# Altium footprint library Cty1.PcbLib: 869 footprints (part 14 of 55)
Each footprint in its own frame and in the unit in brackets; x right, y up, seen from the top. Pads: shape width x height; smd on the part's side, far side on the other; paste and mask are expansions set on the pad; w line width, h text height; cw(c..) or ccw(c..) is an arc to the next point about the centre after c.
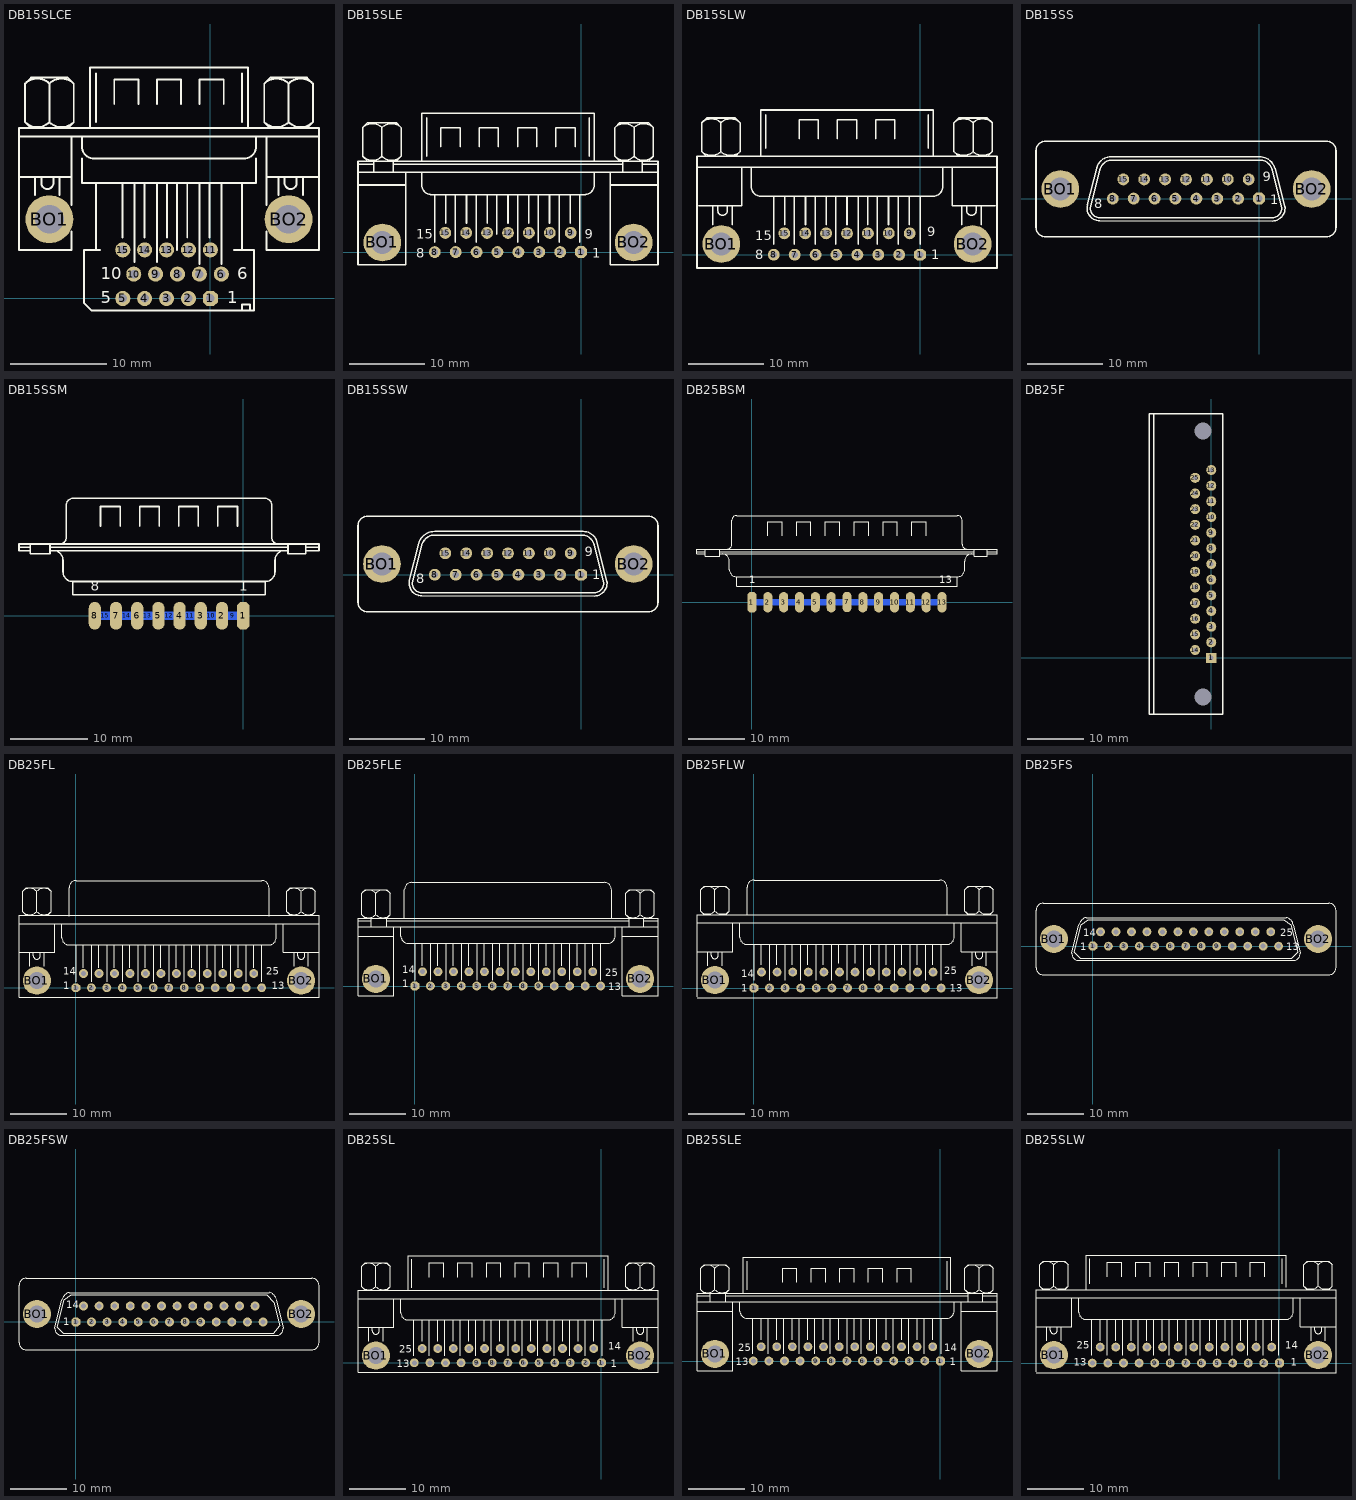
[diagram p13: the footprints below, top view; thin cyan lines are the x and y axes]

## DB15SLCE [mil]
pads (17):
  oct 62x62 hole 35: 1(0,0)
  round 62 hole 35: 2(-90,0) 3(-180,0) 4(-270,0) 5(-360,0) 6(45,100) 7(-45,100) 8(-135,100) 9(-225,100) 10(-315,100) 11(0,200) 12(-90,200) 13(-180,200) 14(-270,200) 15(-360,200)
  round 196.67 hole 118.33: BO1(-661.67,325.83) BO2(321.67,325.83)
Top Overlay:
  lines w8: -786.67,500 -570,500 ; -786.67,666.67 446.67,666.67 ; -761.75,724.91 ccw(c-711.67,775) -661.58,724.91 ; -761.75,883.42 cw(c-711.67,833.33) -661.58,883.42 ; -736.67,700 -761.67,725 -761.67,883.33 -736.67,908.33 -586.67,908.33 -561.67,883.33 -561.67,725 -586.67,700 ; -720,425 -720,500 ; -695,500 -695,475 ccw(c-670,475) -645,475 -645,500 ; -661.75,724.91 ccw(c-611.67,775) -561.58,724.91 ; -661.75,883.42 cw(c-611.67,833.33) -561.58,883.42 ; -661.67,725 -661.67,883.33 ; -620,425 -620,500 ; -570,275 -570,200 -786.67,200 -786.67,700 446.67,700 446.67,200 230,200 230,275 ; -570,383.33 -570,500 ; -570,666.67 -570,500 ; -528.33,575 -528.33,475 188.33,475 188.33,575 ; -528.33,666.67 -528.33,625 ccw(c-478.33,625) -478.33,575 138.33,575 ccw(c138.33,625) 188.33,625 188.33,666.67 ; -495,700 -495,950 155,950 155,700 ; -470,200 -470,475 ; -470,725 -470,925 ; -453.33,200 -520,200 -520,-16.67 -486.67,-50 146.67,-50 180,-50 180,200 96.67,200 ; -395,800 -395,900 -295,900 -295,800 ; -361.67,250 -361.67,475 ; -311.67,150 -311.67,475 ; -270,250 -270,475 ; -220,150 -220,475 ; -220,800 -220,900 -120,900 -120,800 ; -178.33,250 -178.33,475 ; -136.67,200 -136.67,475 ; -95,250 -95,475 ; -45,141.67 -45,475 ; -45,800 -45,900 55,900 55,800 ; -3.33,250 -3.33,475 ; 46.67,141.67 46.67,475 ; 130,-50 130,-25 163.33,-25 163.33,-50 ; 130,200 130,475 ; 130,725 130,925 ; 221.58,724.91 ccw(c271.67,775) 321.75,724.91 ; 221.58,883.42 cw(c271.67,833.33) 321.75,883.42 ; 230,383.33 230,500 ; 230,666.67 230,500 ; 246.67,700 221.67,725 221.67,883.33 246.67,908.33 396.67,908.33 421.67,883.33 421.67,725 396.67,700 ; 280,425 280,500 ; 305,500 305,475 ccw(c330,475) 355,475 355,500 ; 321.58,724.91 ccw(c371.67,775) 421.75,724.91 ; 321.58,883.42 cw(c371.67,833.33) 421.75,883.42 ; 321.67,725 321.67,883.33 ; 380,425 380,500 ; 446.67,500 230,500
  text "1" at 70,-20 h50
  text "10" at -450,80 h50
  text "5" at -450,-20 h50
  text "6" at 110,80 h50

## DB15SLE [mil]
pads (17):
  oct 62x62 hole 35: 1(0,0)
  round 62 hole 35: 2(-109.17,0) 3(-218.33,0) 4(-327.5,0) 5(-436.67,0) 6(-545.83,0) 7(-655,0) 8(-764.17,0) 9(-54.17,100) 10(-163.33,100) 11(-272.5,100) 12(-381.67,100) 13(-490.83,100) 14(-600,100) 15(-709.17,100)
  round 196.67 hole 118.33: BO1(-1037.5,50) BO2(274.17,50)
Top Overlay:
  lines w8: -1165,350 -915,350 ; -1165,416.67 401.67,416.67 ; -1165,458.33 -1081.67,458.33 ; -1140.09,499.91 ccw(c-1090,550) -1039.91,499.91 ; -1140.09,650.09 cw(c-1090,600) -1039.91,650.09 ; -1115,475 -1140,500 -1140,650 -1115,675 -965,675 -940,650 -940,500 -965,475 ; -1081.67,416.67 -1081.67,475 ; -1040.09,499.91 ccw(c-990,550) -939.91,499.91 ; -1040.09,650.09 cw(c-990,600) -939.91,650.09 ; -1040,500 -1040,650 ; -981.67,416.67 -981.67,475 ; -981.67,458.33 218.33,458.33 ; -915,416.67 -915,-66.67 -1165,-66.67 -1165,475 401.67,475 401.67,-66.67 151.67,-66.67 151.67,416.67 ; -831.67,416.67 -831.67,350 ccw(c-781.67,350) -781.67,300 18.33,300 ccw(c18.33,350) 68.33,350 68.33,416.67 ; -831.67,475 -831.67,725 68.33,725 68.33,475 ; -806.67,500 -806.67,700 ; -765,50 -765,300 ; -731.67,550 -731.67,650 -631.67,650 -631.67,550 ; -706.67,150 -706.67,300 ; -656.67,50 -656.67,300 ; -598.33,150 -598.33,300 ; -548.33,50 -548.33,300 ; -531.67,550 -531.67,650 -431.67,650 -431.67,550 ; -490,150 -490,300 ; -440,91.67 -440,300 ; -381.67,150 -381.67,300 ; -331.67,50 -331.67,300 ; -331.67,550 -331.67,650 -231.67,650 -231.67,550 ; -273.33,150 -273.33,300 ; -223.33,50 -223.33,300 ; -165,150 -165,300 ; -131.67,550 -131.67,650 -31.67,650 -31.67,550 ; -115,50 -115,300 ; -56.67,150 -56.67,300 ; -6.67,50 -6.67,300 ; 43.33,500 43.33,700 ; 151.67,350 401.67,350 ; 176.58,499.91 ccw(c226.67,550) 276.75,499.91 ; 176.58,650.09 cw(c226.67,600) 276.75,650.09 ; 201.67,475 176.67,500 176.67,650 201.67,675 351.67,675 376.67,650 376.67,500 351.67,475 ; 218.33,416.67 218.33,475 ; 276.58,499.91 ccw(c326.67,550) 376.75,499.91 ; 276.58,650.09 cw(c326.67,600) 376.75,650.09 ; 276.67,500 276.67,650 ; 318.33,416.67 318.33,475 ; 318.33,458.33 326.67,458.33 401.67,458.33
  text "9" at 18.33,70 h50
  text "1" at 58.33,-30 h50
  text "8" at -861.67,-30 h50
  text "15" at -861.67,70 h50

## DB15SLW [mil]
pads (17):
  oct 62x62 hole 35: 1(0,0)
  round 62 hole 35: 2(-109.17,0) 3(-218.33,0) 4(-327.5,0) 5(-436.67,0) 6(-545.83,0) 7(-655,0) 8(-764.17,0) 9(-54.17,111.67) 10(-163.33,111.67) 11(-272.5,111.67) 12(-381.67,111.67) 13(-490.83,111.67) 14(-600,111.67) 15(-709.17,111.67)
  round 196.67 hole 118.33: BO1(-1037.5,55.83) BO2(274.17,55.83)
Top Overlay:
  lines w8: -1165,455.83 401.67,455.83 ; -1156.67,255.83 -931.67,255.83 -931.67,455.83 ; -1140.09,539.08 ccw(c-1090,589.17) -1039.91,539.08 ; -1140.09,689.25 cw(c-1090,639.17) -1039.91,689.25 ; -1115,514.17 -1140,539.17 -1140,689.17 -1115,714.17 -965,714.17 -940,689.17 -940,539.17 -965,514.17 ; -1081.67,155.83 -1081.67,255.83 ; -1056.67,255.83 -1056.67,230.83 ccw(c-1031.67,230.83) -1006.67,230.83 -1006.67,255.83 ; -1040.09,539.08 ccw(c-990,589.17) -939.91,539.08 ; -1040.09,689.25 cw(c-990,639.17) -939.91,689.25 ; -1040,539.17 -1040,689.17 ; -981.67,155.83 -981.67,255.83 ; -881.67,455.83 -881.67,355.83 ccw(c-831.67,355.83) -831.67,305.83 68.33,305.83 ccw(c68.33,355.83) 118.33,355.83 118.33,455.83 ; -831.67,514.17 -831.67,755.83 68.33,755.83 68.33,514.17 ; -806.67,555.83 -806.67,730.83 ; -765,55.83 -765,305.83 ; -706.67,155.83 -706.67,305.83 ; -656.67,55.83 -656.67,305.83 ; -631.67,605.83 -631.67,705.83 -531.67,705.83 -531.67,605.83 ; -598.33,155.83 -598.33,305.83 ; -548.33,55.83 -548.33,305.83 ; -490,155.83 -490,305.83 ; -440,55.83 -440,305.83 ; -431.67,605.83 -431.67,705.83 -331.67,705.83 -331.67,605.83 ; -381.67,155.83 -381.67,305.83 ; -323.33,55.83 -323.33,305.83 ; -273.33,155.83 -273.33,305.83 ; -231.67,605.83 -231.67,705.83 -131.67,705.83 -131.67,605.83 ; -223.33,55.83 -223.33,305.83 ; -165,155.83 -165,305.83 ; -115,55.83 -115,305.83 ; -56.67,155.83 -56.67,305.83 ; 1.67,55.83 1.67,305.83 ; 43.33,555.83 43.33,730.83 ; 168.33,455.83 168.33,255.83 368.33,255.83 393.33,255.83 ; 176.58,539.08 ccw(c226.67,589.17) 276.75,539.08 ; 176.58,689.25 cw(c226.67,639.17) 276.75,689.25 ; 201.67,514.17 176.67,539.17 176.67,689.17 201.67,714.17 351.67,714.17 376.67,689.17 376.67,539.17 351.67,514.17 ; 218.33,155.83 218.33,255.83 ; 243.33,255.83 243.33,230.83 ccw(c268.33,230.83) 293.33,230.83 293.33,255.83 ; 276.58,539.08 ccw(c326.67,589.17) 376.75,539.08 ; 276.58,689.25 cw(c326.67,639.17) 376.75,689.25 ; 276.67,539.17 276.67,689.17 ; 318.33,155.83 318.33,255.83 ; -1165,-69.17 -1165,514.17 401.67,514.17 401.67,-69.17 -1165,-69.17
  text "9" at 38.33,95.83 h50
  text "1" at 58.33,-24.17 h50
  text "8" at -861.67,-24.17 h50
  text "15" at -861.67,75.83 h50

## DB15SS [mil]
pads (17):
  oct 62x62 hole 35: 1(0,0)
  round 62 hole 35: 2(-109.17,0) 3(-218.33,0) 4(-327.5,0) 5(-436.67,0) 6(-545.83,0) 7(-655,0) 8(-764.17,0) 9(-54.17,100) 10(-163.33,100) 11(-272.5,100) 12(-381.67,100) 13(-490.83,100) 14(-600,100) 15(-709.17,100)
  round 196.67 hole 118.33: BO1(-1037.5,50) BO2(274.17,50)
Top Overlay:
  lines w8: -896.67,-31.67 -848.33,158.33 ; -895.75,-31.62 ccw(c-831.67,-50) -831.67,-116.67 68.33,-118.33 ; -848.03,158.91 cw(c-773.33,141.67) -773.33,218.33 1.67,218.33 cw(c1.67,133.33) 82.95,158.18 ; -831.67,150 -881.67,-50 ccw(c-831.67,-50) -831.67,-100 68.33,-100 ccw(c68.33,-50) 118.33,-50 68.33,150 ; -831.3,149.86 cw(c-765,133.33) -781.53,199.64 ; -781.67,200 18.33,200 ; 18.2,199.64 cw(c1.67,133.33) 67.97,149.86 ; 68.33,-117.5 ccw(c68.33,-50) 135.33,-41.77 ; 83.33,156.67 135,-41.67 ; -1165,-150 ccw(c-1115,-150) -1115,-200 351.67,-200 ccw(c351.67,-150) 401.67,-150 401.67,250 ccw(c351.67,250) 351.67,300 -1115,300 ccw(c-1115,250) -1165,250 -1165,-150
  text "9" at 18.33,90 h50
  text "1" at 58.33,-30 h50
  text "8" at -861.67,-50 h50

## DB15SSM [mm]
pads (15):
  oct 1.587x3.598 smd: 1(0,0)
  oval 1.587x3.598 smd: 2(-2.752,0) 3(-5.503,0) 4(-8.255,0) 5(-11.007,0) 6(-13.758,0) 7(-16.51,0) 8(-19.262,0)
  oval 2x1 smd far side: 9(-1.376,0) 10(-4.127,0) 11(-6.879,0) 12(-9.631,0) 13(-12.382,0) 14(-15.134,0) 15(-17.886,0)
Top Overlay:
  lines w0.203: -29.104,8.89 -27.622,8.89 ; -27.622,8.467 -29.104,8.467 -29.104,9.313 9.842,9.313 9.842,8.467 8.149,8.467 ; -27.622,9.313 -27.622,8.043 -25.082,8.043 -25.082,9.313 ; -25.082,8.467 5.821,8.467 ; -25.082,8.89 5.821,8.89 ; -24.659,8.467 cw(c-24.659,7.197) -23.389,7.197 -23.389,5.715 ccw(c-22.119,5.715) -22.119,4.445 ; -23.812,9.313 ccw(c-23.812,10.16) -22.966,10.16 -22.966,14.393 cw(c-22.119,14.393) -22.119,15.24 2.857,15.24 cw(c2.857,14.393) 3.704,14.393 3.704,10.16 ccw(c4.551,10.16) 4.551,9.313 ; -18.521,11.642 -18.521,14.182 -15.981,14.182 -15.981,11.642 ; -13.441,11.642 -13.441,14.182 -10.901,14.182 -10.901,11.642 ; -8.361,11.642 -8.361,14.182 -5.821,14.182 -5.821,11.642 ; -3.281,11.642 -3.281,14.182 -0.741,14.182 -0.741,11.642 ; 5.397,8.467 ccw(c5.397,7.197) 4.127,7.197 4.127,5.715 cw(c2.857,5.715) 2.857,4.445 ; 5.821,9.313 5.821,8.043 8.149,8.043 8.149,9.313 ; 8.149,8.89 9.842,8.89 ; -22.119,4.445 -22.119,2.752 2.857,2.752 2.857,4.445 ; -22.119,4.445 2.857,4.445
  text "8" at -19.791,3.26 h1.27
  text "1" at -0.487,3.26 h1.27

## DB15SSW [mil]
pads (17):
  oct 62x62 hole 35: 1(0,0)
  round 62 hole 35: 2(-109.17,0) 3(-218.33,0) 4(-327.5,0) 5(-436.67,0) 6(-545.83,0) 7(-655,0) 8(-764.17,0) 9(-54.17,111.67) 10(-163.33,111.67) 11(-272.5,111.67) 12(-381.67,111.67) 13(-490.83,111.67) 14(-600,111.67) 15(-709.17,111.67)
  round 196.67 hole 118.33: BO1(-1040,55.83) BO2(274.17,55.83)
Top Overlay:
  lines w8: -896.67,-29.17 -848.33,164.17 ; -896.35,-28.04 ccw(c-831.67,-44.17) -831.67,-110.83 68.33,-112.5 ; -847.88,164.5 cw(c-765,139.17) -765,225.83 10,225.83 cw(c10,147.5) 79.8,183.06 ; -831.96,155.3 cw(c-756.67,130.83) -781.13,206.12 ; -831.67,155.83 -881.67,-44.17 ccw(c-831.67,-44.17) -831.67,-94.17 68.33,-94.17 ccw(c68.33,-44.17) 118.33,-44.17 68.33,155.83 ; -781.67,205.83 18.33,205.83 ; 18.2,205.47 cw(c1.67,139.17) 67.97,155.7 ; 68.33,-111.67 ccw(c68.33,-44.17) 135.33,-35.94 ; 80,182.5 135,-35.83 ; -1165,-144.17 ccw(c-1115,-144.17) -1115,-194.17 351.67,-194.17 ccw(c351.67,-144.17) 401.67,-144.17 401.67,255.83 ccw(c351.67,255.83) 351.67,305.83 -1115,305.83 ccw(c-1115,255.83) -1165,255.83 -1165,-144.17
  text "9" at 18.33,95.83 h50
  text "1" at 58.33,-24.17 h50
  text "8" at -861.67,-44.17 h50

## DB25BSM [mil]
pads (25):
  oct 62.5x141.67 smd: 1(0,0)
  oval 62.5x141.67 smd: 2(110,0) 3(220,0) 4(330,0) 5(440,0) 6(550,0) 7(660,1.67) 8(770,0) 9(880,0) 10(990,0) 11(1100,0) 12(1210,0) 13(1320,0)
  oval 78.74x39.37 smd far side: 14(55,0) 15(165,0) 16(275,0) 17(385,0) 18(495,0) 19(605,0) 20(715,0) 21(825,0) 22(935,0) 23(1045,0) 24(1155,0) 25(1265,0)
Top Overlay:
  lines w8: -381.67,351.67 -323.33,351.67 ; -323.33,335 -381.67,335 -381.67,368.33 1701.67,368.33 1701.67,335 1635,335 ; -323.33,368.33 -323.33,318.33 -223.33,318.33 -223.33,368.33 ; -223.33,335 1543.33,335 ; -223.33,351.67 1543.33,351.67 ; -206.67,335 cw(c-206.67,285) -156.67,285 -156.67,226.67 ccw(c-106.67,226.67) -106.67,176.67 ; -173.33,368.33 ccw(c-173.33,401.67) -140,401.67 -140,568.33 cw(c-106.67,568.33) -106.67,601.67 1426.67,601.67 cw(c1426.67,568.33) 1460,568.33 1460,401.67 ccw(c1493.33,401.67) 1493.33,368.33 ; 110,460 110,560 210,560 210,460 ; 310,460 310,560 410,560 410,460 ; 510,460 510,560 610,560 610,460 ; 710,460 710,560 810,560 810,460 ; 910,460 910,560 1010,560 1010,460 ; 1110,460 1110,560 1210,560 1210,460 ; 1526.67,335 ccw(c1526.67,285) 1476.67,285 1476.67,226.67 cw(c1426.67,226.67) 1426.67,176.67 ; 1543.33,368.33 1543.33,318.33 1635,318.33 1635,368.33 ; 1635,351.67 1701.67,351.67 ; -106.67,176.67 -106.67,110 1426.67,110 1426.67,176.67 ; -106.67,176.67 1426.67,176.67
  text "1" at -20,130 h50
  text "13" at 1300,130 h50

## DB25F [mil]
pads (27):
  rect 70x70 hole 31.5 unplated: 1(0,0)
  round 70 hole 31.5 unplated: 2(0,109) 3(0,218) 4(0,327) 5(0,436) 6(0,545) 7(0,654) 8(0,763) 9(0,872) 10(0,981) 11(0,1090) 12(0,1199) 13(0,1308) 14(-112,55) 15(-112,164) 16(-112,273) 17(-112,382) 18(-112,491) 19(-112,600) 20(-112,709) 21(-112,818) 22(-112,927) 23(-112,1036) 24(-112,1145) 25(-112,1254)
  round 70 hole 118.11 unplated: ""(-56,-271.98) ""(-56,1579.98)
Top Overlay:
  lines w10: -430.11,-390.09 78.74,-390.09 78.74,1698.09 -430.11,1698.09 ; -430.11,-390.09 -430.11,1698.09 ; -430.11,-390.09 -400,-390.09 -400,1698.09 -430.11,1698.09

## DB25FL [mil]
pads (27):
  oct 62x62 hole 35: 1(0,0)
  round 62 hole 35: 2(108.33,0) 3(216.67,0) 4(325,0) 5(433.33,0) 6(541.67,0) 7(650,0) 8(758.33,0) 9(866.67,0) 10(975,0) 11(1083.33,0) 12(1191.67,0) 13(1300,0) 14(53.33,100) 15(161.67,100) 16(270,100) 17(378.33,100) 18(486.67,100) 19(595,100) 20(703.33,100) 21(811.67,100) 22(920,100) 23(1028.33,100) 24(1136.67,100) 25(1245,100)
  round 196.67 hole 118.33: BO1(-273.33,50) BO2(1576.67,50)
Top Overlay:
  lines w8: -398.33,250 -148.33,250 -148.33,450 ; -398.33,450 1701.67,450 ; -373.42,533.25 ccw(c-323.33,583.33) -273.25,533.25 ; -373.42,675.09 cw(c-323.33,625) -273.25,675.09 ; -348.33,508.33 -373.33,533.33 -373.33,675 -348.33,700 -198.33,700 -173.33,675 -173.33,533.33 -198.33,508.33 ; -323.33,150 -323.33,250 ; -298.33,250 -298.33,225 ccw(c-273.33,225) -248.33,225 -248.33,250 ; -273.42,533.25 ccw(c-223.33,583.33) -173.25,533.25 ; -273.42,675.09 cw(c-223.33,625) -173.25,675.09 ; -273.33,533.33 -273.33,675 ; -223.33,150 -223.33,250 ; -98.33,450 -98.33,350 ccw(c-48.33,350) -48.33,300 1351.67,300 ccw(c1351.67,350) 1401.67,350 1401.67,450 ; -48.33,500 -48.33,700 cw(c1.67,700) 1.67,750 1301.67,750 cw(c1301.67,700) 1351.67,700 1351.67,500 ; 1.67,41.67 1.67,300 ; 51.67,141.67 51.67,300 ; 110,41.67 110,300 ; 160,141.67 160,300 ; 218.33,41.67 218.33,300 ; 268.33,141.67 268.33,300 ; 326.67,41.67 326.67,300 ; 376.67,141.67 376.67,300 ; 435,41.67 435,300 ; 485,141.67 485,300 ; 543.33,41.67 543.33,300 ; 593.33,141.67 593.33,300 ; 651.67,41.67 651.67,300 ; 701.67,141.67 701.67,300 ; 760,41.67 760,300 ; 810,141.67 810,300 ; 868.33,41.67 868.33,300 ; 918.33,141.67 918.33,300 ; 976.67,41.67 976.67,300 ; 1026.67,141.67 1026.67,300 ; 1085,41.67 1085,300 ; 1135,141.67 1135,300 ; 1193.33,41.67 1193.33,300 ; 1243.33,141.67 1243.33,300 ; 1301.67,41.67 1301.67,300 ; 1451.67,450 1451.67,250 1701.67,250 ; 1476.58,533.25 ccw(c1526.67,583.33) 1576.75,533.25 ; 1476.58,675.09 cw(c1526.67,625) 1576.75,675.09 ; 1501.67,508.33 1476.67,533.33 1476.67,675 1501.67,700 1651.67,700 1676.67,675 1676.67,533.33 1651.67,508.33 ; 1526.67,150 1526.67,250 ; 1551.67,250 1551.67,225 ccw(c1576.67,225) 1601.67,225 1601.67,250 ; 1576.58,533.25 ccw(c1626.67,583.33) 1676.75,533.25 ; 1576.58,675.09 cw(c1626.67,625) 1676.75,675.09 ; 1576.67,533.33 1576.67,675 ; 1626.67,150 1626.67,250 ; -398.33,-66.67 1701.67,-66.67 1701.67,508.33 -398.33,508.33 -398.33,-66.67
  text "1" at -88.33,-10 h50
  text "14" at -88.33,90 h50
  text "25" at 1331.67,90 h50
  text "13" at 1371.67,-10 h50

## DB25FLE [mil]
pads (27):
  oct 62x62 hole 35: 1(0,0)
  round 62 hole 35: 2(108.33,0) 3(216.67,0) 4(325,0) 5(433.33,0) 6(541.67,0) 7(650,0) 8(758.33,0) 9(866.67,0) 10(975,0) 11(1083.33,0) 12(1191.67,0) 13(1300,0) 14(53.33,100) 15(161.67,100) 16(270,100) 17(378.33,100) 18(486.67,100) 19(595,100) 20(703.33,100) 21(811.67,100) 22(920,100) 23(1028.33,100) 24(1136.67,100) 25(1245,100)
  round 196.67 hole 118.33: BO1(-273.33,50) BO2(1576.67,50)
Top Overlay:
  lines w8: -398.33,350 -148.33,350 ; -398.33,416.67 1701.67,416.67 ; -398.33,458.33 -306.67,458.33 ; -373.42,499.91 ccw(c-323.33,550) -273.25,499.91 ; -373.42,650.09 cw(c-323.33,600) -273.25,650.09 ; -348.33,475 -373.33,500 -373.33,650 -348.33,675 -198.33,675 -173.33,650 -173.33,500 -198.33,475 -198.33,416.67 ; -306.67,416.67 -306.67,475 ; -273.42,499.91 ccw(c-223.33,550) -173.25,499.91 ; -273.42,650.09 cw(c-223.33,600) -173.25,650.09 ; -273.33,500 -273.33,650 ; -198.33,458.33 1501.67,458.33 ; -148.33,416.67 -148.33,-66.67 -398.33,-66.67 -398.33,475 1701.67,475 1701.67,-66.67 1451.67,-66.67 1451.67,416.67 ; -98.33,416.67 -98.33,350 ccw(c-48.33,350) -48.33,300 1351.67,300 ccw(c1351.67,350) 1401.67,350 1401.67,416.67 ; -73.33,475 -73.33,675 cw(c-23.33,675) -23.33,725 1326.67,725 cw(c1326.67,675) 1376.67,675 1376.67,475 ; 1.67,41.67 1.67,300 ; 51.67,141.67 51.67,300 ; 110,41.67 110,300 ; 160,141.67 160,300 ; 218.33,41.67 218.33,300 ; 268.33,141.67 268.33,300 ; 326.67,41.67 326.67,300 ; 376.67,141.67 376.67,300 ; 435,41.67 435,300 ; 485,141.67 485,300 ; 543.33,41.67 543.33,300 ; 593.33,141.67 593.33,300 ; 651.67,41.67 651.67,300 ; 701.67,141.67 701.67,300 ; 760,41.67 760,300 ; 810,141.67 810,300 ; 868.33,41.67 868.33,300 ; 918.33,141.67 918.33,300 ; 976.67,41.67 976.67,300 ; 1026.67,141.67 1026.67,300 ; 1085,41.67 1085,300 ; 1135,141.67 1135,300 ; 1193.33,41.67 1193.33,300 ; 1243.33,141.67 1243.33,300 ; 1301.67,41.67 1301.67,300 ; 1451.67,350 1701.67,350 ; 1476.58,499.91 ccw(c1526.67,550) 1576.75,499.91 ; 1476.58,650.09 cw(c1526.67,600) 1576.75,650.09 ; 1501.67,416.67 1501.67,475 1476.67,500 1476.67,650 1501.67,675 1651.67,675 1676.67,650 1676.67,500 1651.67,475 ; 1576.58,499.91 ccw(c1626.67,550) 1676.75,499.91 ; 1576.58,650.09 cw(c1626.67,600) 1676.75,650.09 ; 1576.67,500 1576.67,650 ; 1601.67,416.67 1601.67,475 ; 1601.67,458.33 1701.67,458.33
  text "25" at 1331.67,70 h50
  text "13" at 1351.67,-30 h50
  text "1" at -88.33,-10 h50
  text "14" at -88.33,90 h50

## DB25FLW [mil]
pads (27):
  oct 62x62 hole 35: 1(0,0)
  round 62 hole 35: 2(109.17,0) 3(218.33,0) 4(327.5,0) 5(436.67,0) 6(545.83,0) 7(655,0) 8(764.17,0) 9(873.33,0) 10(982.5,0) 11(1091.67,0) 12(1200.83,0) 13(1310,0) 14(53.33,111.67) 15(162.5,111.67) 16(271.67,111.67) 17(380.83,111.67) 18(490,111.67) 19(599.17,111.67) 20(708.33,111.67) 21(817.5,111.67) 22(926.67,111.67) 23(1035.83,111.67) 24(1145,111.67) 25(1254.17,111.67)
  round 196.67 hole 118.33: BO1(-273.33,55.83) BO2(1576.67,55.83)
Top Overlay:
  lines w8: -398.33,-69.17 1701.67,-69.17 1701.67,514.17 -398.33,514.17 -398.33,-60.83 ; -398.33,255.83 -148.33,255.83 -148.33,455.83 ; -398.33,455.83 1701.67,455.83 ; -373.42,539.08 ccw(c-323.33,589.17) -273.25,539.08 ; -373.42,689.25 cw(c-323.33,639.17) -273.25,689.25 ; -348.33,514.17 -373.33,539.17 -373.33,689.17 -348.33,714.17 -198.33,714.17 -173.33,689.17 -173.33,539.17 -198.33,514.17 ; -323.33,155.83 -323.33,255.83 ; -298.33,255.83 -298.33,230.83 ccw(c-273.33,230.83) -248.33,230.83 -248.33,255.83 ; -273.42,539.08 ccw(c-223.33,589.17) -173.25,539.08 ; -273.42,689.25 cw(c-223.33,639.17) -173.25,689.25 ; -273.33,539.17 -273.33,689.17 ; -223.33,155.83 -223.33,255.83 ; -98.33,455.83 -98.33,355.83 ccw(c-48.33,355.83) -48.33,305.83 1351.67,305.83 ccw(c1351.67,355.83) 1401.67,355.83 1401.67,455.83 ; -48.33,514.17 -48.33,705.83 cw(c1.67,705.83) 1.67,755.83 1276.67,755.83 1301.67,755.83 cw(c1301.67,705.83) 1351.67,705.83 1351.67,514.17 ; 1.67,55.83 1.67,305.83 ; 51.67,164.17 51.67,305.83 ; 110,55.83 110,305.83 ; 160,164.17 160,305.83 ; 218.33,55.83 218.33,305.83 ; 268.33,164.17 268.33,305.83 ; 326.67,55.83 326.67,305.83 ; 376.67,164.17 376.67,305.83 ; 435,55.83 435,305.83 ; 485,164.17 485,305.83 ; 543.33,55.83 543.33,305.83 ; 593.33,172.5 593.33,305.83 ; 651.67,55.83 651.67,305.83 ; 710,172.5 710,305.83 ; 768.33,55.83 768.33,305.83 ; 818.33,164.17 818.33,305.83 ; 876.67,55.83 876.67,305.83 ; 926.67,164.17 926.67,305.83 ; 985,55.83 985,305.83 ; 1035,164.17 1035,305.83 ; 1093.33,55.83 1093.33,305.83 ; 1143.33,164.17 1143.33,305.83 ; 1201.67,55.83 1201.67,305.83 ; 1251.67,164.17 1251.67,305.83 ; 1310,55.83 1310,305.83 ; 1451.67,455.83 1451.67,255.83 1701.67,255.83 ; 1476.58,539.08 ccw(c1526.67,589.17) 1576.75,539.08 ; 1476.58,689.25 cw(c1526.67,639.17) 1576.75,689.25 ; 1501.67,514.17 1476.67,539.17 1476.67,689.17 1501.67,714.17 1651.67,714.17 1676.67,689.17 1676.67,539.17 1651.67,514.17 ; 1526.67,155.83 1526.67,255.83 ; 1551.67,255.83 1551.67,230.83 ccw(c1576.67,230.83) 1601.67,230.83 1601.67,255.83 ; 1576.58,539.08 ccw(c1626.67,589.17) 1676.75,539.08 ; 1576.58,689.25 cw(c1626.67,639.17) 1676.75,689.25 ; 1576.67,539.17 1576.67,689.17 ; 1626.67,155.83 1626.67,255.83
  text "14" at -88.33,75.83 h50
  text "1" at -88.33,-24.17 h50
  text "13" at 1371.67,-24.17 h50
  text "25" at 1331.67,95.83 h50

## DB25FS [mil]
pads (27):
  oct 62x62 hole 35: 1(0,0)
  round 62 hole 35: 2(108.33,0) 3(216.67,0) 4(325,0) 5(433.33,0) 6(541.67,0) 7(650,0) 8(758.33,0) 9(866.67,0) 10(975,0) 11(1083.33,0) 12(1191.67,0) 13(1300,0) 14(53.33,100) 15(161.67,100) 16(270,100) 17(378.33,100) 18(486.67,100) 19(595,100) 20(703.33,100) 21(811.67,100) 22(920,100) 23(1028.33,100) 24(1136.67,100) 25(1245,100)
  round 196.67 hole 118.33: BO1(-273.33,50) BO2(1576.67,50)
Top Overlay:
  lines w8: -98.33,150 -148.33,-50 ccw(c-98.33,-50) -98.33,-100 1401.67,-100 ccw(c1401.67,-50) 1451.67,-50 1401.67,150 ; -97.97,149.86 cw(c-31.67,133.33) -48.2,199.64 ; -48.33,200 1351.67,200 ; 1352.59,200.1 cw(c1343.33,141.67) 1401.92,149.9 ; -398.33,-150 ccw(c-348.33,-150) -348.33,-200 1651.67,-200 ccw(c1651.67,-150) 1701.67,-150 1701.67,250 ccw(c1651.67,250) 1651.67,300 -348.33,300 ccw(c-348.33,250) -398.33,250 -398.33,-150 ; -131.67,-41.67 -90,-83.33 1393.33,-83.33 1435,-41.67 1385,150 1335,183.33 -31.67,183.33 -81.67,150 -131.67,-41.67
  text "14" at -68.33,70 h50
  text "1" at -88.33,-30 h50
  text "13" at 1351.67,-30 h50
  text "25" at 1311.67,70 h50

## DB25FSW [mil]
pads (27):
  oct 62x62 hole 35: 1(0,0)
  round 62 hole 35: 2(109.17,0) 3(218.33,0) 4(327.5,0) 5(436.67,0) 6(545.83,0) 7(655,0) 8(764.17,0) 9(873.33,0) 10(982.5,0) 11(1091.67,0) 12(1200.83,0) 13(1310,0) 14(53.33,111.67) 15(162.5,111.67) 16(271.67,111.67) 17(380.83,111.67) 18(490,111.67) 19(599.17,111.67) 20(708.33,111.67) 21(817.5,111.67) 22(926.67,111.67) 23(1035.83,111.67) 24(1145,111.67) 25(1254.17,111.67)
  round 196.67 hole 118.33: BO1(-273.33,55.83) BO2(1576.67,55.83)
Top Overlay:
  lines w8: -98.33,-94.17 1401.67,-94.17 ccw(c1401.67,-44.17) 1451.67,-44.17 1401.67,155.83 ; -98.33,155.83 -148.33,-44.17 ccw(c-98.33,-44.17) -90.51,-93.55 ; -97.97,155.7 cw(c-31.67,139.17) -48.2,205.47 ; -48.33,205.83 1351.67,205.83 ; 1354.52,207.26 cw(c1335,139.17) 1401.13,164.55 ; -398.33,-144.17 ccw(c-348.33,-144.17) -348.33,-194.17 1651.67,-194.17 ccw(c1651.67,-144.17) 1701.67,-144.17 1701.67,255.83 ccw(c1651.67,255.83) 1651.67,305.83 -348.33,305.83 ccw(c-348.33,255.83) -398.33,255.83 -398.33,-144.17 ; -131.67,-35.83 -90,-77.5 1385,-77.5 1426.67,-27.5 1385,139.17 1335,189.17 -31.67,189.17 -81.67,155.83 -131.67,-35.83
  text "1" at -88.33,-24.17 h50
  text "14" at -68.33,95.83 h50

## DB25SL [mil]
pads (27):
  oct 62x62 hole 35: 1(0,0)
  round 62 hole 35: 2(-109.17,0) 3(-218.33,0) 4(-327.5,0) 5(-436.67,0) 6(-545.83,0) 7(-655,0) 8(-764.17,0) 9(-873.33,0) 10(-982.5,0) 11(-1091.67,0) 12(-1200.83,0) 13(-1310,0) 14(-54.17,100) 15(-163.33,100) 16(-272.5,100) 17(-381.67,100) 18(-490.83,100) 19(-600,100) 20(-709.17,100) 21(-818.33,100) 22(-927.5,100) 23(-1036.67,100) 24(-1145.83,100) 25(-1255,100)
  round 196.67 hole 118.33: BO1(-1579.17,50) BO2(270.83,50)
Top Overlay:
  lines w8: -1704.17,250 -1454.17,250 -1454.17,450 ; -1704.17,450 395.83,450 ; -1679.25,533.25 ccw(c-1629.17,583.33) -1579.08,533.25 ; -1679.25,675.09 cw(c-1629.17,625) -1579.08,675.09 ; -1654.17,508.33 -1679.17,533.33 -1679.17,675 -1654.17,700 -1504.17,700 -1479.17,675 -1479.17,533.33 -1504.17,508.33 ; -1629.17,150 -1629.17,250 ; -1604.17,250 -1604.17,225 ccw(c-1579.17,225) -1554.17,225 -1554.17,250 ; -1579.25,533.25 ccw(c-1529.17,583.33) -1479.08,533.25 ; -1579.25,675.09 cw(c-1529.17,625) -1479.08,675.09 ; -1579.17,533.33 -1579.17,675 ; -1529.17,150 -1529.17,250 ; -1404.17,450 -1404.17,350 ccw(c-1354.17,350) -1354.17,300 45.83,300 ccw(c45.83,350) 95.83,350 95.83,450 ; -1354.17,508.33 -1354.17,750 45.83,750 45.83,508.33 ; -1329.17,525 -1329.17,725 ; -1312.5,50 -1312.5,300 ; -1254.17,150 -1254.17,300 ; -1204.17,50 -1204.17,300 ; -1204.17,600 -1204.17,700 -1104.17,700 -1104.17,600 ; -1145.83,150 -1145.83,300 ; -1095.83,50 -1095.83,300 ; -1037.5,150 -1037.5,300 ; -1004.17,600 -1004.17,700 -904.17,700 -904.17,600 ; -987.5,50 -987.5,300 ; -929.17,150 -929.17,300 ; -879.17,50 -879.17,300 ; -820.83,150 -820.83,300 ; -804.17,600 -804.17,700 -704.17,700 -704.17,600 ; -770.83,50 -770.83,300 ; -712.5,150 -712.5,300 ; -654.17,50 -654.17,300 ; -604.17,150 -604.17,300 ; -604.17,600 -604.17,700 -504.17,700 -504.17,600 ; -554.17,50 -554.17,300 ; -495.83,150 -495.83,300 ; -445.83,50 -445.83,300 ; -404.17,600 -404.17,700 -304.17,700 -304.17,600 ; -379.17,150 -379.17,300 ; -329.17,50 -329.17,300 ; -270.83,150 -270.83,300 ; -220.83,50 -220.83,300 ; -204.17,600 -204.17,700 -104.17,700 -104.17,600 ; -162.5,150 -162.5,300 ; -112.5,50 -112.5,300 ; -54.17,150 -54.17,300 ; 4.17,50 4.17,300 ; 20.83,525 20.83,725 ; 145.83,450 145.83,250 395.83,250 ; 170.75,533.25 ccw(c220.83,583.33) 270.92,533.25 ; 170.75,675.09 cw(c220.83,625) 270.92,675.09 ; 195.83,508.33 170.83,533.33 170.83,675 195.83,700 345.83,700 370.83,675 370.83,533.33 345.83,508.33 ; 220.83,150 220.83,250 ; 245.83,250 245.83,225 ccw(c270.83,225) 295.83,225 295.83,250 ; 270.75,533.25 ccw(c320.83,583.33) 370.92,533.25 ; 270.75,675.09 cw(c320.83,625) 370.92,675.09 ; 270.83,533.33 270.83,675 ; 320.83,150 320.83,250 ; -1704.17,-66.67 395.83,-66.67 395.83,508.33 -1704.17,508.33 -1704.17,-66.67
  text "25" at -1414.17,70 h50
  text "13" at -1434.17,-30 h50
  text "1" at 65.83,-30 h50
  text "14" at 45.83,90 h50

## DB25SLE [mil]
pads (27):
  oct 62x62 hole 35: 1(0,0)
  round 62 hole 35: 2(-109.17,0) 3(-218.33,0) 4(-327.5,0) 5(-436.67,0) 6(-545.83,0) 7(-655,0) 8(-764.17,0) 9(-873.33,0) 10(-982.5,0) 11(-1091.67,0) 12(-1200.83,0) 13(-1310,0) 14(-54.17,100) 15(-163.33,100) 16(-272.5,100) 17(-381.67,100) 18(-490.83,100) 19(-600,100) 20(-709.17,100) 21(-818.33,100) 22(-927.5,100) 23(-1036.67,100) 24(-1145.83,100) 25(-1255,100)
  round 196.67 hole 118.33: BO1(-1579.17,50) BO2(270.83,50)
Top Overlay:
  lines w8: -1704.17,350 -1454.17,350 ; -1704.17,416.67 395.83,416.67 ; -1704.17,458.33 -1612.5,458.33 ; -1679.25,499.91 ccw(c-1629.17,550) -1579.08,499.91 ; -1679.25,650.09 cw(c-1629.17,600) -1579.08,650.09 ; -1654.17,475 -1679.17,500 -1679.17,650 -1654.17,675 -1504.17,675 -1479.17,650 -1479.17,500 -1504.17,475 -1504.17,416.67 ; -1612.5,416.67 -1612.5,475 ; -1579.25,499.91 ccw(c-1529.17,550) -1479.08,499.91 ; -1579.25,650.09 cw(c-1529.17,600) -1479.08,650.09 ; -1579.17,500 -1579.17,650 ; -1504.17,458.33 195.83,458.33 ; -1454.17,416.67 -1454.17,-66.67 -1704.17,-66.67 -1704.17,475 395.83,475 395.83,-66.67 145.83,-66.67 145.83,416.67 ; -1404.17,416.67 -1404.17,350 ccw(c-1354.17,350) -1354.17,300 45.83,300 ccw(c45.83,350) 95.83,350 95.83,416.67 ; -1379.17,475 -1379.17,725 70.83,725 70.83,475 ; -1354.17,500 -1354.17,700 ; -1312.5,50 -1312.5,300 ; -1254.17,150 -1254.17,300 ; -1204.17,50 -1204.17,300 ; -1145.83,150 -1145.83,300 ; -1104.17,550 -1104.17,650 -1004.17,650 -1004.17,550 ; -1095.83,50 -1095.83,300 ; -1037.5,150 -1037.5,300 ; -987.5,50 -987.5,300 ; -929.17,150 -929.17,300 ; -904.17,550 -904.17,650 -804.17,650 -804.17,550 ; -879.17,50 -879.17,300 ; -820.83,150 -820.83,300 ; -770.83,50 -770.83,300 ; -712.5,150 -712.5,300 ; -704.17,550 -704.17,650 -604.17,650 -604.17,550 ; -654.17,50 -654.17,300 ; -604.17,150 -604.17,300 ; -554.17,50 -554.17,300 ; -504.17,550 -504.17,650 -404.17,650 -404.17,550 ; -495.83,150 -495.83,300 ; -445.83,50 -445.83,300 ; -379.17,150 -379.17,300 ; -329.17,50 -329.17,300 ; -304.17,550 -304.17,650 -204.17,650 -204.17,550 ; -270.83,150 -270.83,300 ; -220.83,50 -220.83,300 ; -162.5,150 -162.5,300 ; -112.5,50 -112.5,300 ; -54.17,150 -54.17,300 ; 4.17,50 4.17,300 ; 45.83,500 45.83,700 ; 145.83,350 395.83,350 ; 170.75,499.91 ccw(c220.83,550) 270.92,499.91 ; 170.75,650.09 cw(c220.83,600) 270.92,650.09 ; 195.83,416.67 195.83,475 170.83,500 170.83,650 195.83,675 345.83,675 370.83,650 370.83,500 345.83,475 ; 270.75,499.91 ccw(c320.83,550) 370.92,499.91 ; 270.75,650.09 cw(c320.83,600) 370.92,650.09 ; 270.83,500 270.83,650 ; 295.83,416.67 295.83,475 ; 295.83,458.33 395.83,458.33
  text "25" at -1414.17,70 h50
  text "13" at -1434.17,-30 h50
  text "1" at 65.83,-30 h50
  text "14" at 25.83,70 h50

## DB25SLW [mil]
pads (27):
  oct 62x62 hole 35: 1(0,0)
  round 62 hole 35: 2(-109.17,0) 3(-218.33,0) 4(-327.5,0) 5(-436.67,0) 6(-545.83,0) 7(-655,0) 8(-764.17,0) 9(-873.33,0) 10(-982.5,0) 11(-1091.67,0) 12(-1200.83,0) 13(-1310,0) 14(-54.17,111.67) 15(-163.33,111.67) 16(-272.5,111.67) 17(-381.67,111.67) 18(-490.83,111.67) 19(-600,111.67) 20(-709.17,111.67) 21(-818.33,111.67) 22(-927.5,111.67) 23(-1036.67,111.67) 24(-1145.83,111.67) 25(-1255,111.67)
  round 196.67 hole 118.33: BO1(-1579.17,55.83) BO2(270.83,55.83)
Top Overlay:
  lines w8: -1704.17,-69.17 395.83,-69.17 395.83,514.17 -1704.17,514.17 -1704.17,-60.83 ; -1704.17,255.83 -1454.17,255.83 -1454.17,455.83 ; -1704.17,455.83 395.83,455.83 ; -1679.25,539.08 ccw(c-1629.17,589.17) -1579.08,539.08 ; -1679.25,689.25 cw(c-1629.17,639.17) -1579.08,689.25 ; -1654.17,514.17 -1679.17,539.17 -1679.17,689.17 -1654.17,714.17 -1504.17,714.17 -1479.17,689.17 -1479.17,539.17 -1504.17,514.17 ; -1629.17,155.83 -1629.17,255.83 ; -1604.17,255.83 -1604.17,230.83 ccw(c-1579.17,230.83) -1554.17,230.83 -1554.17,255.83 ; -1579.25,539.08 ccw(c-1529.17,589.17) -1479.08,539.08 ; -1579.25,689.25 cw(c-1529.17,639.17) -1479.08,689.25 ; -1579.17,539.17 -1579.17,689.17 ; -1529.17,155.83 -1529.17,255.83 ; -1404.17,455.83 -1404.17,355.83 ccw(c-1354.17,355.83) -1354.17,305.83 45.83,305.83 ccw(c45.83,355.83) 95.83,355.83 95.83,455.83 ; -1354.17,514.17 -1354.17,755.83 45.83,755.83 45.83,530.83 ; -1329.17,555.83 -1329.17,730.83 ; -1312.5,55.83 -1312.5,305.83 ; -1254.17,155.83 -1254.17,305.83 ; -1204.17,55.83 -1204.17,305.83 ; -1204.17,605.83 -1204.17,705.83 -1104.17,705.83 -1104.17,605.83 ; -1145.83,155.83 -1145.83,305.83 ; -1095.83,55.83 -1095.83,305.83 ; -1037.5,155.83 -1037.5,305.83 ; -1004.17,605.83 -1004.17,705.83 -904.17,705.83 -904.17,605.83 ; -987.5,55.83 -987.5,305.83 ; -929.17,155.83 -929.17,305.83 ; -879.17,55.83 -879.17,305.83 ; -820.83,155.83 -820.83,305.83 ; -804.17,605.83 -804.17,705.83 -704.17,705.83 -704.17,605.83 ; -770.83,55.83 -770.83,305.83 ; -712.5,155.83 -712.5,305.83 ; -654.17,55.83 -654.17,305.83 ; -604.17,155.83 -604.17,305.83 ; -604.17,605.83 -604.17,705.83 -504.17,705.83 -504.17,605.83 ; -554.17,55.83 -554.17,305.83 ; -487.5,155.83 -487.5,305.83 ; -437.5,55.83 -437.5,305.83 ; -404.17,605.83 -404.17,705.83 -304.17,705.83 -304.17,605.83 ; -379.17,155.83 -379.17,305.83 ; -329.17,55.83 -329.17,305.83 ; -270.83,155.83 -270.83,305.83 ; -220.83,55.83 -220.83,305.83 ; -204.17,605.83 -204.17,705.83 -104.17,705.83 -104.17,605.83 ; -162.5,155.83 -162.5,305.83 ; -112.5,55.83 -112.5,305.83 ; -54.17,155.83 -54.17,305.83 ; -4.17,55.83 -4.17,305.83 ; 20.83,555.83 20.83,730.83 ; 145.83,455.83 145.83,255.83 395.83,255.83 ; 170.75,539.08 ccw(c220.83,589.17) 270.92,539.08 ; 170.75,689.25 cw(c220.83,639.17) 270.92,689.25 ; 195.83,514.17 170.83,539.17 170.83,689.17 195.83,714.17 345.83,714.17 370.83,689.17 370.83,539.17 345.83,514.17 ; 220.83,155.83 220.83,255.83 ; 245.83,255.83 245.83,230.83 ccw(c270.83,230.83) 295.83,230.83 295.83,255.83 ; 270.75,539.08 ccw(c320.83,589.17) 370.92,539.08 ; 270.75,689.25 cw(c320.83,639.17) 370.92,689.25 ; 270.83,539.17 270.83,689.17 ; 320.83,155.83 320.83,255.83
  text "13" at -1440,-20 h50
  text "25" at -1420,100 h50
  text "14" at 40,100 h50
  text "1" at 80,-20 h50